# Altium footprint library LukaLIBRARY.PcbLib: 772 footprints (part 31 of 49)
Each footprint in its own frame and in the unit in brackets; x right, y up, seen from the top. Pads: shape width x height; smd on the part's side, far side on the other; paste and mask are expansions set on the pad; w line width, h text height; cw(c..) or ccw(c..) is an arc to the next point about the centre after c.
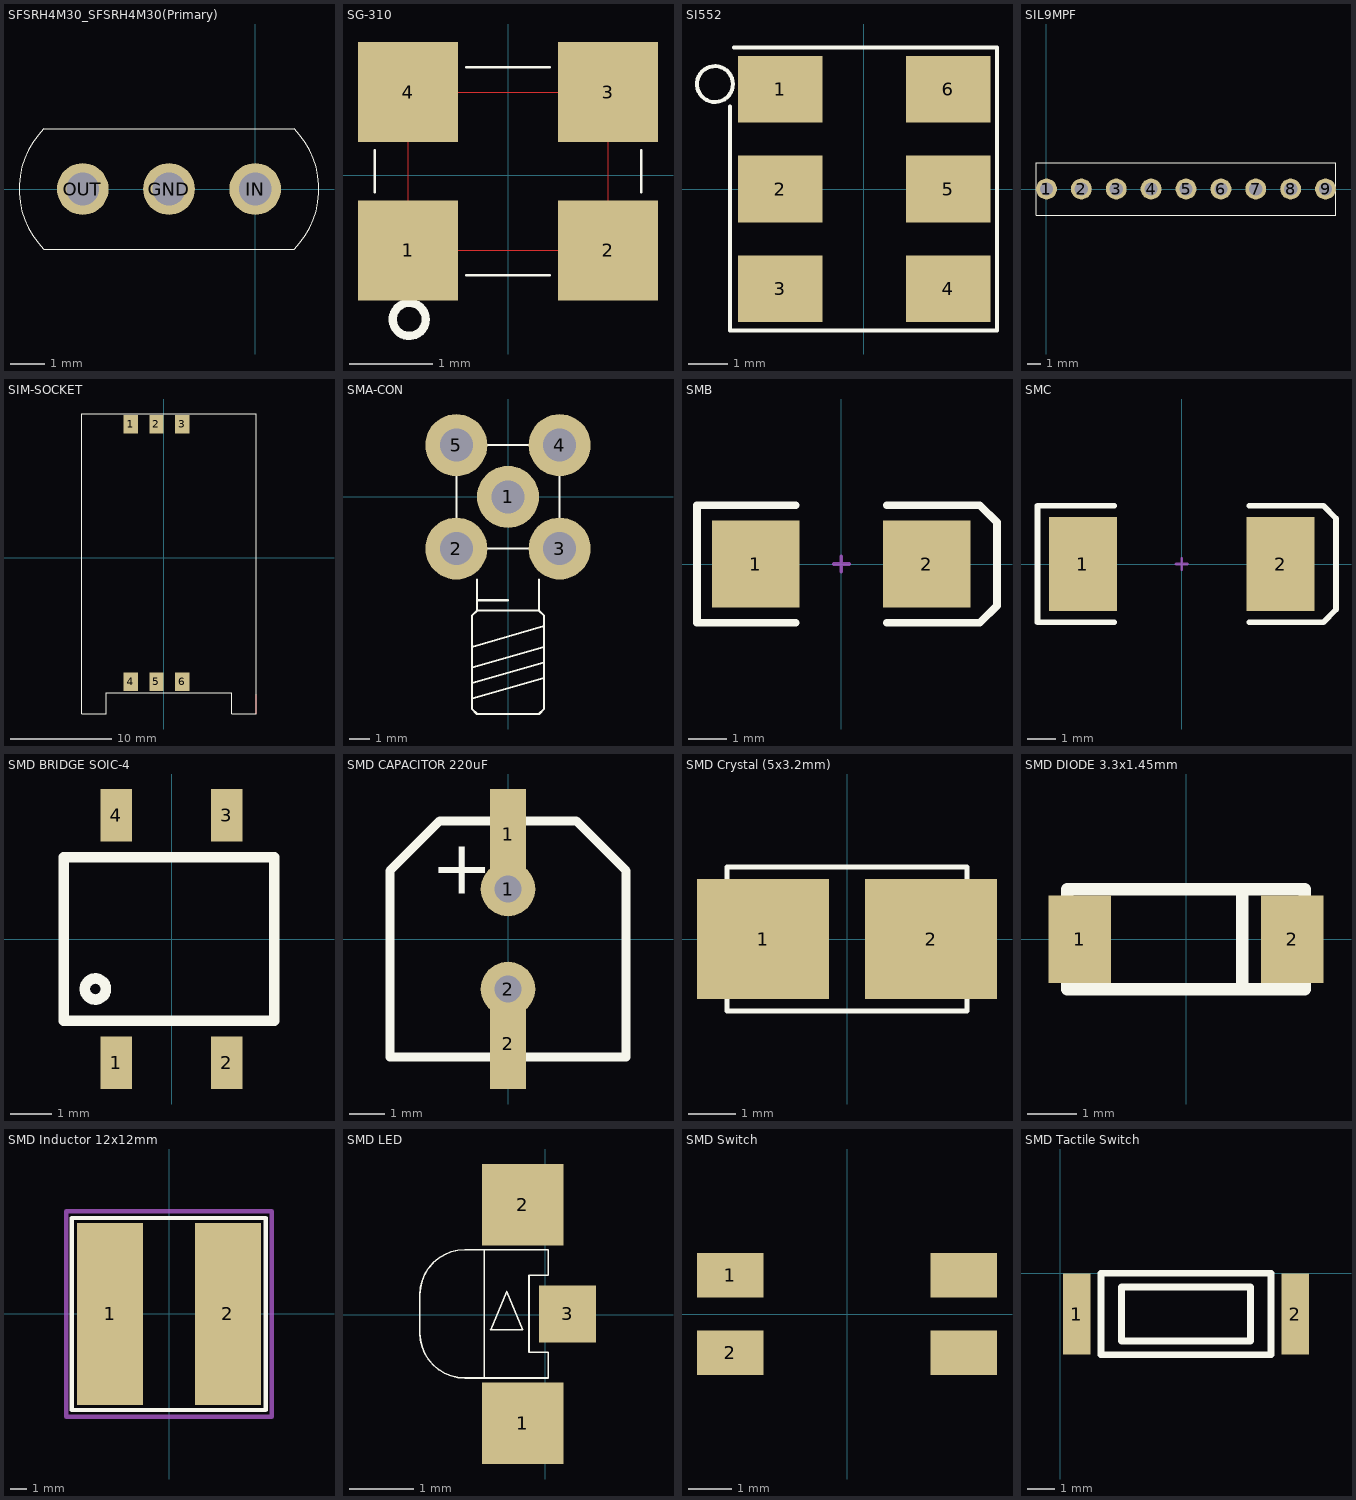
[diagram p30: the footprints below, top view; thin cyan lines are the x and y axes]

## SFSRH4M30_SFSRH4M30(Primary) [mil]
pads (3):
  round 60 hole 38: GND(-100,0) IN(0,0) OUT(-200,0)
Top Overlay:
  lines w1: -245,-70 cw(c-175,0) -245,70 45,70 cw(c-25,0) 45,-70 -245,-70

## SG-310 [mm]
pads (4):
  rect 1.2x1.2 smd: 1(-1.2,-0.9) 2(1.2,-0.9) 3(1.2,1) 4(-1.2,1)
Top Layer:
  lines w0.01: -1.2,-0.9 1.2,-0.9 1.2,1 -1.2,1 -1.2,-0.9
Top Overlay:
  circle w0.1: c-1.185,-1.728 r0.198
  lines w0.03: -1.6,-0.2 -1.6,0.3 ; -0.5,-1.2 0.5,-1.2 ; -0.5,1.3 0.5,1.3 ; 1.6,-0.2 1.6,0.3

## SI552 [mm]
pads (6):
  rect 2.15x1.7 smd mask-25.4: 1(-2.12,2.54) 2(-2.12,0) 3(-2.12,-2.54) 4(2.16,-2.54) 5(2.16,0) 6(2.16,2.54)
Top Overlay:
  circle w0.1: c-3.785,2.672 r0.457
  lines w0.1: -3.4,2.1 -3.4,-3.6 3.4,-3.6 3.4,3.6 -3.3,3.6
Top Solder:
  region: -3.195,-3.39 -1.045,-3.39 -1.045,-1.69 -3.195,-1.69
  region: -3.195,1.69 -1.045,1.69 -1.045,3.39 -3.195,3.39
  region: 1.085,-3.39 3.235,-3.39 3.235,-1.69 1.085,-1.69
  region: 1.085,1.69 3.235,1.69 3.235,3.39 1.085,3.39
  region: -3.195,-0.85 -1.045,-0.85 -1.045,0.85 -3.195,0.85
  region: 1.085,-0.85 3.235,-0.85 3.235,0.85 1.085,0.85

## SIL9MPF [mil]
pads (9):
  round 60 hole 38: 1(0,0) 2(100,0) 3(200,0) 4(300,0) 5(400,0) 6(500,0) 7(600,0) 8(700,0) 9(800,0)
Top Overlay:
  lines w1: -30,-75 -30,75 830,75 830,-75 -30,-75

## SIM-SOCKET [mm]
pads (6):
  rect 1.4x1.8 smd mask-25.4: 1(-3.28,13.18) 2(-0.74,13.18) 3(1.8,13.18) 4(-3.28,-12.22) 5(-0.74,-12.22) 6(1.8,-12.22)
Top Layer:
  lines w0.03: -8.1,-15.4 -8.1,-10.5 ; 9.1,-15.4 9.1,-13.5
Top Overlay:
  lines w0.03: -8.1,-15.4 -5.7,-15.4 -5.7,-13.3 6.7,-13.3 6.7,-15.4 9.1,-15.4 9.1,14.2 -8.1,14.2 -8.1,-15.4
Top Solder:
  region: -3.915,-12.931 -2.645,-12.931 -2.645,-11.509 -3.915,-11.509
  region: -3.915,12.469 -2.645,12.469 -2.645,13.891 -3.915,13.891
  region: 1.165,-12.931 2.435,-12.931 2.435,-11.509 1.165,-11.509
  region: 1.165,12.469 2.435,12.469 2.435,13.891 1.165,13.891
  region: -1.375,-12.931 -0.105,-12.931 -0.105,-11.509 -1.375,-11.509
  region: -1.375,12.469 -0.105,12.469 -0.105,13.891 -1.375,13.891

## SMA-CON [mm]
pads (5):
  round 3 hole 1.6 mask-25.4: 1(0,0) 2(-2.5,-2.5) 3(2.5,-2.5) 4(2.5,2.5) 5(-2.5,2.5)
Top Overlay:
  lines w0.1: -2.5,-1 -2.5,1 ; -1.75,-9.75 1.75,-8.75 ; -1.75,-9 1.75,-8 ; -1.75,-8.25 1.75,-7.25 ; -1.75,-7.25 1.75,-6.25 ; -1.5,-5 0,-5 ; -1.5,-4 -1.5,-5.5 ; -1,-2.5 0,-2.5 1,-2.5 ; -1,2.5 1,2.5 ; 0,-10.5 1.5,-10.5 1.75,-10.25 1.75,-5.75 1.5,-5.5 ; 0.25,-10.5 -1.5,-10.5 -1.75,-10.25 -1.75,-5.75 -1.5,-5.5 ; 1.5,-4 1.5,-5.5 ; 2.5,-1 2.5,1 ; -1.5,-5.5 0,-5.5 1.5,-5.5
Top Solder:
  drawing of 5 lines, arcs and shapes, not listed
Bottom Solder:
  drawing of 5 lines, arcs and shapes, not listed

## SMB [mm] "DO-214-AA/SMB; 2 C-Bend Leads; Body 5.3 x 3.6 mm, inc. leads (LxW)"
height 2.54
pads (2):
  rect 2.3x2.3 smd: 1(-2.25,0) 2(2.25,0)
Top Overlay:
  lines w0.2: -1.2,-1.55 -3.8,-1.55 -3.8,1.55 -1.2,1.55 ; 1.2,-1.55 3.65,-1.55 4.1,-1.1 4.1,1.1 3.65,1.55 1.2,1.55
Mechanical 1:
  lines w0.1: -0.2,0 0.2,0 ; 0,-0.2 0,0.2

## SMC [mm] "DO-214-AB/SMC; 2 C-Bend Leads; Body 7.9 x 5.9 mm, inc. leads (LxW)"
height 2.65
pads (2):
  rect 2.4x3.3 smd: 1(-3.475,0) 2(3.475,0)
Top Overlay:
  lines w0.2: -2.375,-2.05 -5.075,-2.05 -5.075,2.05 -2.375,2.05 ; 2.375,-2.05 4.975,-2.05 5.425,-1.6 5.425,1.6 4.975,2.055 ; 2.375,2.05 4.975,2.05
Mechanical 1:
  lines w0.1: -0.2,0 0.2,0 ; 0,-0.2 0,0.2

## SMD BRIDGE SOIC-4 [mil]
pads (4):
  rect 30x50 smd: 1(-52.5,-117.5) 2(52.5,-117.5) 3(52.5,117.5) 4(-52.5,117.5)
Top Overlay:
  circle w10: c-72.5,-47.5 r10
  lines w10: -102.5,-77.5 97.5,-77.5 97.5,77.5 -102.5,77.5 -102.5,-77.5

## SMD CAPACITOR 220uF [mil]
pads (4):
  round 60 hole 30: 1(0,55) 2(0,-55)
  rect 40x100 smd: 1(0,115) 2(0,-115)
Top Overlay:
  lines w10: -130,-130 -130,75 -75,130 75,130 130,75 130,-130 -130,-130
  text "+" at -85,50 h60

## SMD Crystal (5x3.2mm) [mil]
pads (2):
  rect 110x100 smd: 1(-70,0) 2(70,0)
Top Overlay:
  lines w3.94: -100,-60 100,-60 100,60 -100,60 -100,-60

## SMD DIODE 3.3x1.45mm [mil]
pads (2):
  rect 50x70 smd: 1(-85,0) 2(85,0)
Top Overlay:
  lines w10: 45,-40 45,40 ; -95,-40 95,-40 95,40 -95,40 -95,-40

## SMD Inductor 12x12mm [mm]
pads (2):
  rect 4x11 smd: 1(-3.556,0) 2(3.556,0)
Top Overlay:
  lines w0.254: -5.867,-5.791 -5.867,5.791 5.842,5.791 5.842,-5.791 -5.867,-5.791
Mechanical 15:
  lines w0.254: -6.198,-6.202 -6.198,6.198 6.202,6.198 6.202,-6.202 -6.198,-6.202

## SMD LED [mm]
pads (3):
  rect 1.27x1.27 smd: 1(-0.35,-1.69) 2(-0.35,1.714)
  rect 0.889x0.889 smd: 3(0.35,0.015)
Top Overlay:
  lines w0.025: -0.95,-0.985 0.05,-0.985 0.05,-0.586 -0.25,-0.586 -0.25,0.614 0.05,0.614 0.05,1.014 -0.95,1.014 ; -0.95,-0.985 -0.95,1.014 ; -0.95,-0.985 -1.25,-0.985 cw(c-1.25,-0.286) -1.95,-0.286 -1.95,0.315 cw(c-1.25,0.315) -1.25,1.014 -0.95,1.014 ; -0.85,-0.236 -0.35,-0.236 -0.6,0.365 -0.85,-0.236

## SMD Switch [mil]
pads (4):
  rect 60x40 smd: 1(-105,35) 2(-105,-35) ""(105,-35) ""(105,35)

## SMD Tactile Switch [mm]
pads (2):
  rect 1x3 smd: 1(0.6,-1.5) 2(8.65,-1.5)
Top Overlay:
  lines w0.254: 1.5,-3 7.75,-3 7.75,0 1.5,0 1.5,-3 ; 2.25,-2.5 7,-2.5 7,-0.5 2.25,-0.5 2.25,-2.5